# Altium footprint library CPU_STM.PcbLib: 216 footprints (part 4 of 15)
Each footprint in its own frame and in the unit in brackets; x right, y up, seen from the top. Pads: shape width x height; smd on the part's side, far side on the other; paste and mask are expansions set on the pad; w line width, h text height; cw(c..) or ccw(c..) is an arc to the next point about the centre after c.
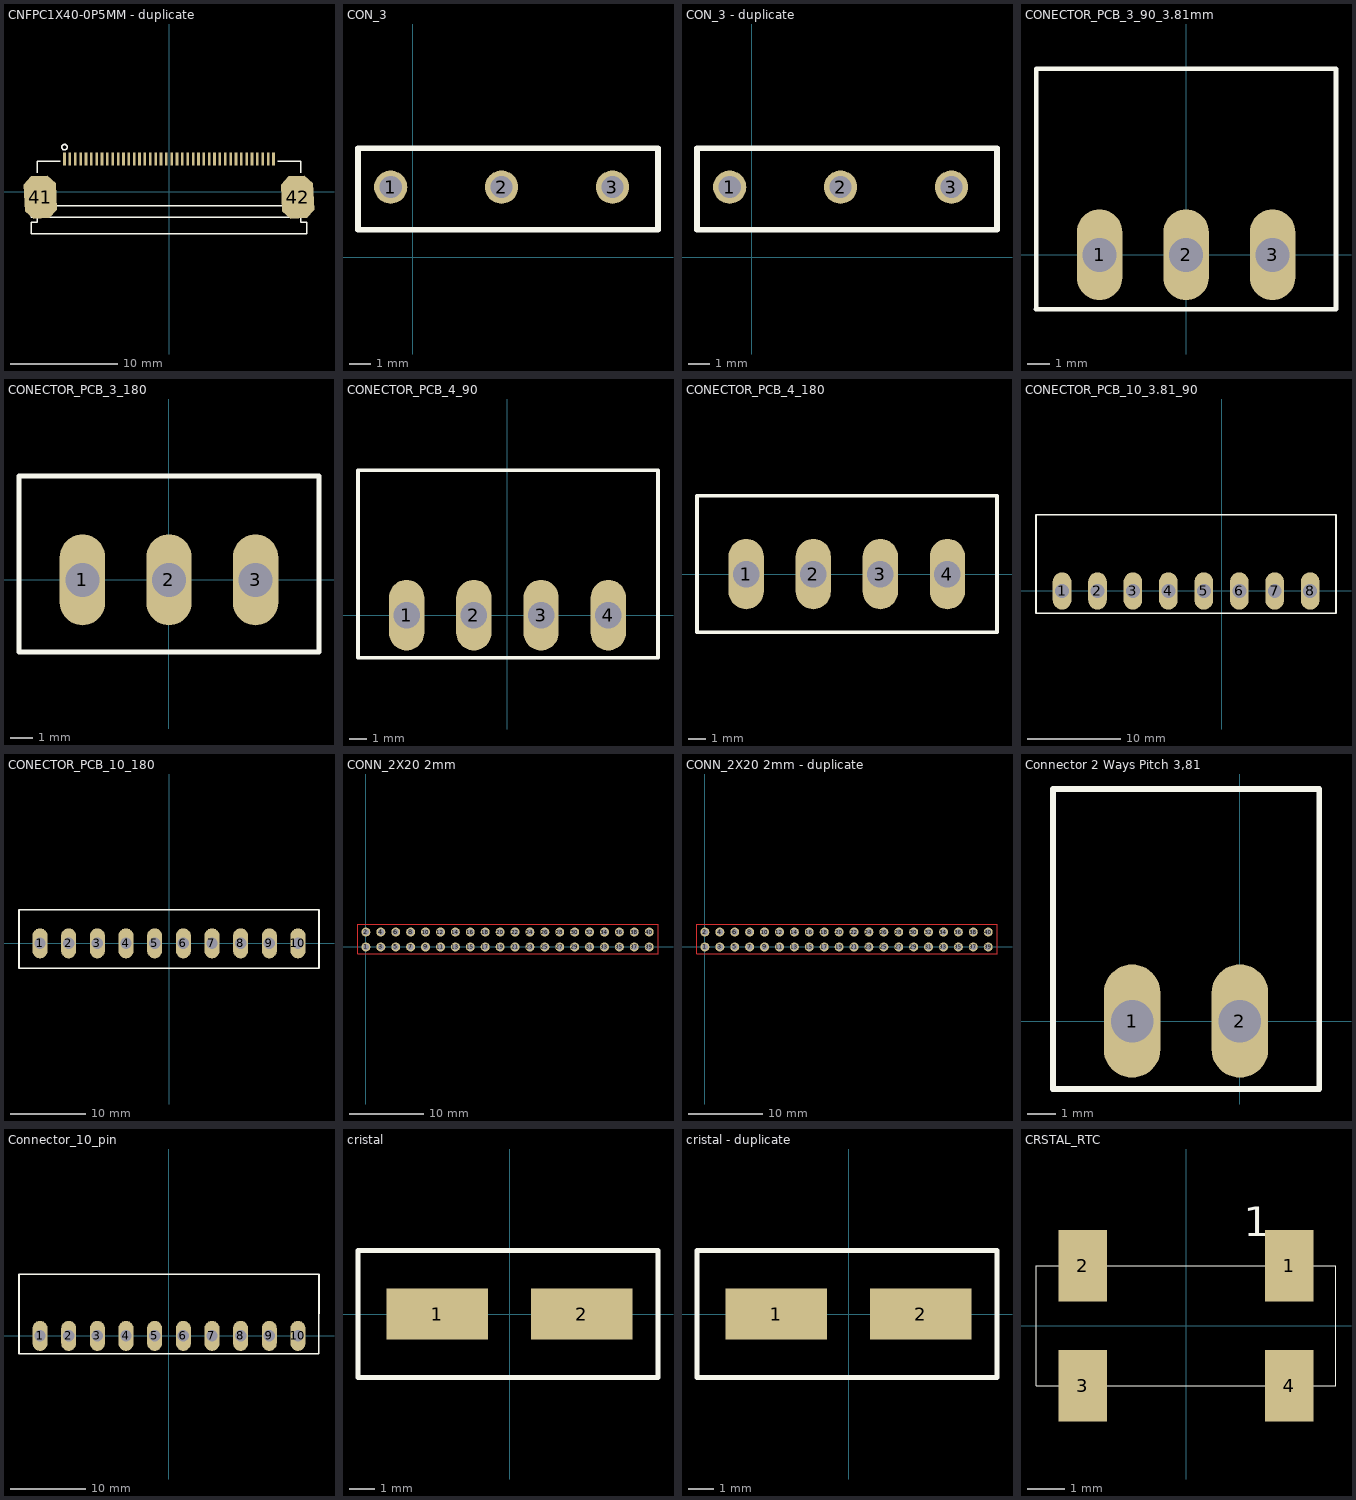
[diagram p3: the footprints below, top view; thin cyan lines are the x and y axes]

## CNFPC1X40-0P5MM - duplicate [mil] "CNFPC1X40-0P5MM"
pads (42):
  rect 9.84x47.24 smd mask+2.36: 1(-383.86,120) 2(-364.17,120) 3(-344.49,120) 4(-324.8,120) 5(-305.12,120) 6(-285.43,120) 7(-265.75,120) 8(-246.06,120) 9(-226.38,120) 10(-206.69,120) 11(-187.01,120) 12(-167.32,120) 13(-147.64,120) 14(-127.95,120) 15(-108.27,120) 16(-88.58,120) 17(-68.9,120) 18(-49.21,120) 19(-29.53,120) 20(-9.84,120) 21(9.84,120) 22(29.53,120) 23(49.21,120) 24(68.9,120) 25(88.58,120) 26(108.27,120) 27(127.95,120) 28(147.64,120) 29(167.32,120) 30(187.01,120) 31(206.69,120) 32(226.38,120) 33(246.06,120) 34(265.75,120) 35(285.43,120) 36(305.12,120) 37(324.8,120) 38(344.49,120) 39(364.17,120) 40(383.86,120)
  oct 118.11x157.48 smd rot 3 mask+2.36: 41(-472.44,-19.68) 42(472.44,-19.68)
Top Overlay:
  circle w5: c-383.86,164.29 r10
  lines w5: -483.27,-43.55 -483.27,-112.29 -506.89,-112.29 -506.89,-153.62 506.89,-153.62 506.89,-112.29 483.27,-112.29 483.27,-43.55 ; -483.27,70.94 -483.27,112.12 -398.78,112.12 ; 398.78,112.12 483.27,112.12 483.27,70.94 ; -506.89,-92.6 506.89,-92.6 506.89,-51.26 -506.89,-51.26 -506.89,-92.6

## CON_3 [mil]
pads (3):
  round 60 hole 40: 1(-39.37,126.38) 2(160.63,126.38) 3(360.63,126.38)
Top Overlay:
  lines w10: -98.43,49.21 -98.43,196.85 442.91,196.85 442.91,49.21 -98.43,49.21

## CON_3 - duplicate [mil]
pads (3):
  round 60 hole 40: 1(-39.37,126.38) 2(160.63,126.38) 3(360.63,126.38)
Top Overlay:
  lines w10: -98.43,49.21 -98.43,196.85 442.91,196.85 442.91,49.21 -98.43,49.21

## CONECTOR_PCB_3_90_3.81mm [mm]
pads (3):
  oval 2x4 hole 1.5: 1(-3.81,0) 2(0,0) 3(3.81,0)
Top Overlay:
  lines w0.2: -6.61,-2.4 6.6,-2.4 ; -6.604,-2.4 -6.604,8.2 6.604,8.2 6.604,-2.4
3D body "3pin_90_3.81mm.stp": height 7.25, standoff -3.4, extent -6.41,-1.3 6.41,8

## CONECTOR_PCB_3_180 [mm]
pads (3):
  oval 2x4 hole 1.5: 1(-3.81,0) 2(0,0) 3(3.81,0)
Top Overlay:
  lines w0.2: -6.604,-3.175 -6.604,4.572 6.604,4.572 6.604,-3.175 -6.604,-3.175
3D body "3pin_180_3.81mm.stp": height 9.7, standoff -3.3, extent -6.41,-2.932 6.41,4.318

## CONECTOR_PCB_4_90 [mm]
pads (4):
  oval 2x4 hole 1.5: 1(-5.715,0) 2(-1.905,0) 3(1.905,0) 4(5.715,0)
Top Overlay:
  lines w0.2: -8.47,-2.4 8.53,-2.4 8.53,8.2 -8.47,8.2 -8.47,-2.4
3D body "4pin_90_3.81mm.STEP": height 7.25, standoff -3.4, extent -8.286,-1.3 8.346,8

## CONECTOR_PCB_4_180 [mm]
pads (4):
  oval 2x4 hole 1.5: 1(-17.145,0) 2(-13.335,0) 3(-9.525,0) 4(-5.715,0)
Top Overlay:
  lines w0.2: -19.939,-3.302 -19.939,4.445 -2.9,4.445 -2.9,-3.302 -19.939,-3.302
3D body "4pin_180_3.81mm.STEP": height 9.4, standoff -3.2, extent -19.715,-3.05 -3.085,4.2

## CONECTOR_PCB_10_3.81_90 [mm]
pads (8):
  oval 2x4 hole 1.5: 1(-17.145,0) 2(-13.335,0) 3(-9.525,0) 4(-5.715,0) 5(-1.905,0) 6(1.905,0) 7(5.715,0) 8(9.525,0)
Top Overlay:
  lines w0.2: -19.945,-2.4 12.3,-2.4 12.3,8.2 -19.945,8.2 -19.945,-2.4
3D body "8pin_90_3.81mm.stp": height 7.25, standoff -3.4, extent -19.735,-1.3 12.135,8

## CONECTOR_PCB_10_180 [mm]
pads (10):
  oval 2x4 hole 1.5: 1(-17.145,0) 2(-13.335,0) 3(-9.525,0) 4(-5.715,0) 5(-1.905,0) 6(1.905,0) 7(5.715,0) 8(9.525,0) 9(13.335,0) 10(17.145,0)
Top Overlay:
  lines w0.2: -19.939,-3.302 19.939,-3.302 19.939,4.445 -19.939,4.445 -19.939,-3.302
3D body "10pin_180_3.81mm.stp": height 9.4, standoff -3.6, extent -19.745,-3.059 19.745,4.191

## CONN_2X20 2mm [mm]
pads (40):
  round 1.2 hole 0.8: 1(0,0) 2(0,2) 3(2,0) 4(2,2) 5(4,0) 6(4,2) 7(6,0) 8(6,2) 9(8,0) 10(8,2) 11(10,0) 12(10,2) 13(12,0) 14(12,2) 15(14,0) 16(14,2) 17(16,0) 18(16,2) 19(18,0) 20(18,2) 21(20,0) 22(20,2) 23(22,0) 24(22,2) 25(24,0) 26(24,2) 27(26,0) 28(26,2) 29(28,0) 30(28,2) 31(30,0) 32(30,2) 33(32,0) 34(32,2) 35(34,0) 36(34,2) 37(36,0) 38(36,2) 39(38,0) 40(38,2)
Top Layer:
  lines w0.1: -1.06,-0.92 -1.04,-0.94 39.18,-0.94 39.18,3.08 -1.06,3.08 -1.06,-0.92

## CONN_2X20 2mm - duplicate [mm]
pads (40):
  round 1.2 hole 0.8: 1(0,0) 2(0,2) 3(2,0) 4(2,2) 5(4,0) 6(4,2) 7(6,0) 8(6,2) 9(8,0) 10(8,2) 11(10,0) 12(10,2) 13(12,0) 14(12,2) 15(14,0) 16(14,2) 17(16,0) 18(16,2) 19(18,0) 20(18,2) 21(20,0) 22(20,2) 23(22,0) 24(22,2) 25(24,0) 26(24,2) 27(26,0) 28(26,2) 29(28,0) 30(28,2) 31(30,0) 32(30,2) 33(32,0) 34(32,2) 35(34,0) 36(34,2) 37(36,0) 38(36,2) 39(38,0) 40(38,2)
Top Layer:
  lines w0.1: -1.06,-0.92 -1.04,-0.94 39.18,-0.94 39.18,3.08 -1.06,3.08 -1.06,-0.92

## Connector 2 Ways Pitch 3,81 [mm]
pads (2):
  oval 2x4 hole 1.5: 1(-3.81,0) 2(0,0)
Top Overlay:
  lines w0.2: -6.61,-2.4 2.8,-2.4 2.8,8.2 -6.604,8.2 -6.604,-2.4
3D body "User Library-1803277.step": height 7.26, standoff -3.39, extent -6.41,-1.3 2.6,8

## Connector_10_pin [mm]
pads (10):
  oval 2x4 hole 1.5: 1(-17.145,0) 2(-13.335,0) 3(-9.525,0) 4(-5.715,0) 5(-1.905,0) 6(1.905,0) 7(5.715,0) 8(9.525,0) 9(13.335,0) 10(17.145,0)
Top Overlay:
  lines w0.2: 19.935,8.2 -19.945,8.2 -19.945,-2.4 19.935,-2.4 19.945,8.2
3D body "10pin_90_3.81mm.STEP": height 7.26, standoff -3.39, extent -19.796,-1.395 19.694,7.905

## cristal [mm]
pads (2):
  rect 4x2 smd: 1(-2.845,0) 2(2.845,0)
Top Overlay:
  lines w0.2: -5.969,-2.5 -5.969,1.761 -5.969,2.5 5.842,2.5 5.842,-2.5 -5.969,-2.5

## cristal - duplicate [mm]
pads (2):
  rect 4x2 smd: 1(-2.845,0) 2(2.845,0)
Top Overlay:
  lines w0.2: -5.969,-2.5 -5.969,1.761 -5.969,2.5 5.842,2.5 5.842,-2.5 -5.969,-2.5

## CRSTAL_RTC [mm] "MC-306"
pads (4):
  rect 1.3x1.9 smd: 1(2.75,1.6) 2(-2.75,1.6) 3(-2.75,-1.6) 4(2.75,-1.6)
Top Overlay:
  lines w0.025: -4,-1.6 -4,1.6 4,1.6 4,-1.6 -4,-1.6
  text "1" at 1.536,2.383 h0.79
3D body "RTC.step": height 1.6, standoff 0.1, extent -3.45,-1.45 3.65,1.65